# Altium schematic symbol library jlcpcb_2025_04_inductors_extended_0402.schlib: 1396 symbols (part 1 of 8) (continued)
## CLH1005T-3N9S-S
designator L?  Inductance: 3.9nH
Inductor, 3.9nH, 180mΩ, 400mA, SMD 0402; Manufacturer: Chilisin Elec; Manufacturer Part Number: CLH1005T-3N9S-S; Self-Resonant Frequency: 6.1GHz; Q Factor: 8@100MHz; Package Size: 0402; JLCPCB Basic Part: No; JLCPCB Part Number: C108257; Supplier 1: LCSC; Category: Inductors; Supplier Part Number 1: C108257; Rated Current: 400mA; DC Resistance: 180mΩ; RoHS: Yes; ComponentLink1Description: Datasheet; ComponentLink1URL: https://wmsc.lcsc.com/wmsc/upload/file/pdf/v2/lcsc/2304140030_Chilisin-Elec-CLH1005T-3N9S-S_C108257.pdf; ComponentLink2Description: JLCPCB Part URL; ComponentLink2URL: https://jlcpcb.com/partdetail/C108257; ComponentLink3Description: LCSC Part URL; ComponentLink3URL: https://lcsc.com/product-detail/Inductors-SMD_Chilisin-Elec-Chilisin-Elec-CLH1005T-3N9S-S_C108257.html
footprint IND-0402 (0402 (1005M) Inductor)
pins: 1, 2

## CLH1005T-3N9S-S-NP
designator L?  Inductance: 3.9nH
Inductor, 3.9nH, 180mΩ, 400mA, SMD 0402; Manufacturer: Chilisin Elec; Manufacturer Part Number: CLH1005T-3N9S-S-NP; Self-Resonant Frequency: 6.1GHz; Q Factor: 8@100MHz; Package Size: 0402; JLCPCB Basic Part: No; JLCPCB Part Number: C142225; Supplier 1: LCSC; Category: Inductors; Supplier Part Number 1: C142225; Rated Current: 400mA; DC Resistance: 180mΩ; RoHS: Yes; ComponentLink1Description: Datasheet; ComponentLink1URL: https://wmsc.lcsc.com/wmsc/upload/file/pdf/v2/lcsc/2304140030_Chilisin-Elec-CLH1005T-3N9S-S-NP_C142225.pdf; ComponentLink2Description: JLCPCB Part URL; ComponentLink2URL: https://jlcpcb.com/partdetail/C142225; ComponentLink3Description: LCSC Part URL; ComponentLink3URL: https://lcsc.com/product-detail/Inductors-SMD_Chilisin-Elec-Chilisin-Elec-CLH1005T-3N9S-S-NP_C142225.html
footprint IND-0402 (0402 (1005M) Inductor)
pins: 1, 2

## CLH1005T-4N3S-S
designator L?  Inductance: 4.3nH
Inductor, 4.3nH, 160mΩ, 400mA, SMD 0402; Manufacturer: Chilisin Elec; Manufacturer Part Number: CLH1005T-4N3S-S; Self-Resonant Frequency: 6GHz; Q Factor: 8@100MHz; Package Size: 0402; JLCPCB Basic Part: No; JLCPCB Part Number: C108258; Supplier 1: LCSC; Category: Inductors; Supplier Part Number 1: C108258; Rated Current: 400mA; DC Resistance: 160mΩ; RoHS: Yes; ComponentLink1Description: Datasheet; ComponentLink1URL: https://wmsc.lcsc.com/wmsc/upload/file/pdf/v2/lcsc/2304140030_Chilisin-Elec-CLH1005T-4N3S-S_C108258.pdf; ComponentLink2Description: JLCPCB Part URL; ComponentLink2URL: https://jlcpcb.com/partdetail/C108258; ComponentLink3Description: LCSC Part URL; ComponentLink3URL: https://lcsc.com/product-detail/Inductors-SMD_Chilisin-Elec-Chilisin-Elec-CLH1005T-4N3S-S_C108258.html
footprint IND-0402 (0402 (1005M) Inductor)
pins: 1, 2

## CLH1005T-4N7S-S-NP
designator L?  Inductance: 4.7nH
Inductor, 4.7nH, 180mΩ, 400mA, SMD 0402; Manufacturer: Chilisin Elec; Manufacturer Part Number: CLH1005T-4N7S-S-NP; Self-Resonant Frequency: 6GHz; Q Factor: 8@100MHz; Package Size: 0402; JLCPCB Basic Part: No; JLCPCB Part Number: C142221; Supplier 1: LCSC; Category: Inductors; Supplier Part Number 1: C142221; Rated Current: 400mA; DC Resistance: 180mΩ; RoHS: Yes; ComponentLink1Description: Datasheet; ComponentLink1URL: https://wmsc.lcsc.com/wmsc/upload/file/pdf/v2/lcsc/2304140030_Chilisin-Elec-CLH1005T-4N7S-S-NP_C142221.pdf; ComponentLink2Description: JLCPCB Part URL; ComponentLink2URL: https://jlcpcb.com/partdetail/C142221; ComponentLink3Description: LCSC Part URL; ComponentLink3URL: https://lcsc.com/product-detail/Inductors-SMD_Chilisin-Elec-Chilisin-Elec-CLH1005T-4N7S-S-NP_C142221.html
footprint IND-0402 (0402 (1005M) Inductor)
pins: 1, 2

## CLH1005T-5N1S-H
designator L?  Inductance: 5.1nH
Inductor, 5.1nH, SMD 0402; Manufacturer: Chilisin Elec; Manufacturer Part Number: CLH1005T-5N1S-H; Package Size: 0402; JLCPCB Basic Part: No; JLCPCB Part Number: C329635; Supplier 1: LCSC; Category: Inductors; Supplier Part Number 1: C329635; RoHS: Yes; ComponentLink1Description: Datasheet; ComponentLink1URL: https://wmsc.lcsc.com/wmsc/upload/file/pdf/v2/lcsc/1912111437_Chilisin-Elec-CLH1005T-5N1S-H_C329635.pdf; ComponentLink2Description: JLCPCB Part URL; ComponentLink2URL: https://jlcpcb.com/partdetail/C329635; ComponentLink3Description: LCSC Part URL; ComponentLink3URL: https://lcsc.com/product-detail/Inductors-SMD_Chilisin-Elec-Chilisin-Elec-CLH1005T-5N1S-H_C329635.html
footprint IND-0402 (0402 (1005M) Inductor)
pins: 1, 2

## CLH1005T-5N1S-S
designator L?  Inductance: 5.1nH
Inductor, 5.1nH, 200mΩ, 400mA, SMD 0402; Manufacturer: Chilisin Elec; Manufacturer Part Number: CLH1005T-5N1S-S; Self-Resonant Frequency: 5.3GHz; Q Factor: 8@100MHz; Package Size: 0402; JLCPCB Basic Part: No; JLCPCB Part Number: C142219; Supplier 1: LCSC; Category: Inductors; Supplier Part Number 1: C142219; Rated Current: 400mA; DC Resistance: 200mΩ; RoHS: Yes; ComponentLink1Description: Datasheet; ComponentLink1URL: https://wmsc.lcsc.com/wmsc/upload/file/pdf/v2/lcsc/2304140030_Chilisin-Elec-CLH1005T-5N1S-S_C142219.pdf; ComponentLink2Description: JLCPCB Part URL; ComponentLink2URL: https://jlcpcb.com/partdetail/C142219; ComponentLink3Description: LCSC Part URL; ComponentLink3URL: https://lcsc.com/product-detail/Inductors-SMD_Chilisin-Elec-Chilisin-Elec-CLH1005T-5N1S-S_C142219.html
footprint IND-0402 (0402 (1005M) Inductor)
pins: 1, 2

## CLH1005T-5N1S-S-NP
designator L?  Inductance: 5.1nH
Inductor, 5.1nH, 200mΩ, 400mA, SMD 0402; Manufacturer: Chilisin Elec; Manufacturer Part Number: CLH1005T-5N1S-S-NP; Self-Resonant Frequency: 5.3GHz; Q Factor: 8@100MHz; Package Size: 0402; JLCPCB Basic Part: No; JLCPCB Part Number: C142218; Supplier 1: LCSC; Category: Inductors; Supplier Part Number 1: C142218; Rated Current: 400mA; DC Resistance: 200mΩ; RoHS: Yes; ComponentLink1Description: Datasheet; ComponentLink1URL: https://wmsc.lcsc.com/wmsc/upload/file/pdf/v2/lcsc/2304140030_Chilisin-Elec-CLH1005T-5N1S-S-NP_C142218.pdf; ComponentLink2Description: JLCPCB Part URL; ComponentLink2URL: https://jlcpcb.com/partdetail/C142218; ComponentLink3Description: LCSC Part URL; ComponentLink3URL: https://lcsc.com/product-detail/Inductors-SMD_Chilisin-Elec-Chilisin-Elec-CLH1005T-5N1S-S-NP_C142218.html
footprint IND-0402 (0402 (1005M) Inductor)
pins: 1, 2

## CLH1005T-5N6S-S
designator L?  Inductance: 5.6nH
Inductor, 5.6nH, 200mΩ, 400mA, SMD 0402; Manufacturer: Chilisin Elec; Manufacturer Part Number: CLH1005T-5N6S-S; Self-Resonant Frequency: 5.1GHz; Q Factor: 8@100MHz; Package Size: 0402; JLCPCB Basic Part: No; JLCPCB Part Number: C108259; Supplier 1: LCSC; Category: Inductors; Supplier Part Number 1: C108259; Rated Current: 400mA; DC Resistance: 200mΩ; RoHS: Yes; ComponentLink1Description: Datasheet; ComponentLink1URL: https://wmsc.lcsc.com/wmsc/upload/file/pdf/v2/lcsc/2304140030_Chilisin-Elec-CLH1005T-5N6S-S_C108259.pdf; ComponentLink2Description: JLCPCB Part URL; ComponentLink2URL: https://jlcpcb.com/partdetail/C108259; ComponentLink3Description: LCSC Part URL; ComponentLink3URL: https://lcsc.com/product-detail/Inductors-SMD_Chilisin-Elec-Chilisin-Elec-CLH1005T-5N6S-S_C108259.html
footprint IND-0402 (0402 (1005M) Inductor)
pins: 1, 2

## CLH1005T-5N6S-S-NP
designator L?  Inductance: 5.6nH
Inductor, 5.6nH, 200mΩ, 400mA, SMD 0402; Manufacturer: Chilisin Elec; Manufacturer Part Number: CLH1005T-5N6S-S-NP; Self-Resonant Frequency: 5.1GHz; Q Factor: 8@100MHz; Package Size: 0402; JLCPCB Basic Part: No; JLCPCB Part Number: C142217; Supplier 1: LCSC; Category: Inductors; Supplier Part Number 1: C142217; Rated Current: 400mA; DC Resistance: 200mΩ; RoHS: Yes; ComponentLink1Description: Datasheet; ComponentLink1URL: https://wmsc.lcsc.com/wmsc/upload/file/pdf/v2/lcsc/2304140030_Chilisin-Elec-CLH1005T-5N6S-S-NP_C142217.pdf; ComponentLink2Description: JLCPCB Part URL; ComponentLink2URL: https://jlcpcb.com/partdetail/C142217; ComponentLink3Description: LCSC Part URL; ComponentLink3URL: https://lcsc.com/product-detail/Inductors-SMD_Chilisin-Elec-Chilisin-Elec-CLH1005T-5N6S-S-NP_C142217.html
footprint IND-0402 (0402 (1005M) Inductor)
pins: 1, 2

## CLH1005T-6N2J-S-NP
designator L?  Inductance: 6.2nH
Inductor, 6.2nH, ±5%, 220mΩ, 400mA, SMD 0402; Manufacturer: Chilisin Elec; Manufacturer Part Number: CLH1005T-6N2J-S-NP; Self-Resonant Frequency: 4.5GHz; Q Factor: 8@100MHz; Package Size: 0402; JLCPCB Basic Part: No; JLCPCB Part Number: C329636; Supplier 1: LCSC; Category: Inductors; Supplier Part Number 1: C329636; Tolerance: ±5%; Rated Current: 400mA; DC Resistance: 220mΩ; RoHS: Yes; ComponentLink1Description: Datasheet; ComponentLink1URL: https://wmsc.lcsc.com/wmsc/upload/file/pdf/v2/lcsc/1912111437_Chilisin-Elec-CLH1005T-6N2J-S-NP_C329636.pdf; ComponentLink2Description: JLCPCB Part URL; ComponentLink2URL: https://jlcpcb.com/partdetail/C329636; ComponentLink3Description: LCSC Part URL; ComponentLink3URL: https://lcsc.com/product-detail/Inductors-SMD_Chilisin-Elec-Chilisin-Elec-CLH1005T-6N2J-S-NP_C329636.html
footprint IND-0402 (0402 (1005M) Inductor)
pins: 1, 2

## CLH1005T-6N2S-S-NP
designator L?  Inductance: 6.2nH
Inductor, 6.2nH, 220mΩ, 400mA, SMD 0402; Manufacturer: Chilisin Elec; Manufacturer Part Number: CLH1005T-6N2S-S-NP; Self-Resonant Frequency: 4.5GHz; Q Factor: 8@100MHz; Package Size: 0402; JLCPCB Basic Part: No; JLCPCB Part Number: C122957; Supplier 1: LCSC; Category: Inductors; Supplier Part Number 1: C122957; Rated Current: 400mA; DC Resistance: 220mΩ; RoHS: Yes; ComponentLink1Description: Datasheet; ComponentLink1URL: https://wmsc.lcsc.com/wmsc/upload/file/pdf/v2/lcsc/2304140030_Chilisin-Elec-CLH1005T-6N2S-S-NP_C122957.pdf; ComponentLink2Description: JLCPCB Part URL; ComponentLink2URL: https://jlcpcb.com/partdetail/C122957; ComponentLink3Description: LCSC Part URL; ComponentLink3URL: https://lcsc.com/product-detail/Inductors-SMD_Chilisin-Elec-Chilisin-Elec-CLH1005T-6N2S-S-NP_C122957.html
footprint IND-0402 (0402 (1005M) Inductor)
pins: 1, 2

## CLH1005T-6N8J-S
designator L?  Inductance: 6.8nH
Inductor, 6.8nH, ±5%, 240mΩ, 400mA, SMD 0402; Manufacturer: Chilisin Elec; Manufacturer Part Number: CLH1005T-6N8J-S; Self-Resonant Frequency: 4.55GHz; Q Factor: 8@100MHz; Package Size: 0402; JLCPCB Basic Part: No; JLCPCB Part Number: C108260; Supplier 1: LCSC; Category: Inductors; Supplier Part Number 1: C108260; Tolerance: ±5%; Rated Current: 400mA; DC Resistance: 240mΩ; RoHS: Yes; ComponentLink1Description: Datasheet; ComponentLink1URL: https://wmsc.lcsc.com/wmsc/upload/file/pdf/v2/lcsc/2304140030_Chilisin-Elec-CLH1005T-6N8J-S_C108260.pdf; ComponentLink2Description: JLCPCB Part URL; ComponentLink2URL: https://jlcpcb.com/partdetail/C108260; ComponentLink3Description: LCSC Part URL; ComponentLink3URL: https://lcsc.com/product-detail/Inductors-SMD_Chilisin-Elec-Chilisin-Elec-CLH1005T-6N8J-S_C108260.html
footprint IND-0402 (0402 (1005M) Inductor)
pins: 1, 2

## CLH1005T-6N8J-S-NP
designator L?  Inductance: 6.8nH
Inductor, 6.8nH, ±5%, 240mΩ, 400mA, SMD 0402; Manufacturer: Chilisin Elec; Manufacturer Part Number: CLH1005T-6N8J-S-NP; Self-Resonant Frequency: 4.55GHz; Q Factor: 8@100MHz; Package Size: 0402; JLCPCB Basic Part: No; JLCPCB Part Number: C142216; Supplier 1: LCSC; Category: Inductors; Supplier Part Number 1: C142216; Tolerance: ±5%; Rated Current: 400mA; DC Resistance: 240mΩ; RoHS: Yes; ComponentLink1Description: Datasheet; ComponentLink1URL: https://wmsc.lcsc.com/wmsc/upload/file/pdf/v2/lcsc/2304140030_Chilisin-Elec-CLH1005T-6N8J-S-NP_C142216.pdf; ComponentLink2Description: JLCPCB Part URL; ComponentLink2URL: https://jlcpcb.com/partdetail/C142216; ComponentLink3Description: LCSC Part URL; ComponentLink3URL: https://lcsc.com/product-detail/Inductors-SMD_Chilisin-Elec-Chilisin-Elec-CLH1005T-6N8J-S-NP_C142216.html
footprint IND-0402 (0402 (1005M) Inductor)
pins: 1, 2

## CLH1005T-7N5J-S-NP
designator L?  Inductance: 7.5nH
Inductor, 7.5nH, ±5%, 250mΩ, 400mA, SMD 0402; Manufacturer: Chilisin Elec; Manufacturer Part Number: CLH1005T-7N5J-S-NP; Self-Resonant Frequency: 4.2GHz; Q Factor: 8@100MHz; Package Size: 0402; JLCPCB Basic Part: No; JLCPCB Part Number: C142215; Supplier 1: LCSC; Category: Inductors; Supplier Part Number 1: C142215; Tolerance: ±5%; Rated Current: 400mA; DC Resistance: 250mΩ; RoHS: Yes; ComponentLink1Description: Datasheet; ComponentLink1URL: https://wmsc.lcsc.com/wmsc/upload/file/pdf/v2/lcsc/2304140030_Chilisin-Elec-CLH1005T-7N5J-S-NP_C142215.pdf; ComponentLink2Description: JLCPCB Part URL; ComponentLink2URL: https://jlcpcb.com/partdetail/C142215; ComponentLink3Description: LCSC Part URL; ComponentLink3URL: https://lcsc.com/product-detail/Inductors-SMD_Chilisin-Elec-Chilisin-Elec-CLH1005T-7N5J-S-NP_C142215.html
footprint IND-0402 (0402 (1005M) Inductor)
pins: 1, 2

## CLH1005T-8N2J-S
designator L?  Inductance: 8.2nH
Inductor, 8.2nH, ±5%, 240mΩ, 300mA, SMD 0402; Manufacturer: Chilisin Elec; Manufacturer Part Number: CLH1005T-8N2J-S; Self-Resonant Frequency: 4.1GHz; Q Factor: 8@100MHz; Package Size: 0402; JLCPCB Basic Part: No; JLCPCB Part Number: C108262; Supplier 1: LCSC; Category: Inductors; Supplier Part Number 1: C108262; Tolerance: ±5%; Rated Current: 300mA; DC Resistance: 240mΩ; RoHS: Yes; ComponentLink1Description: Datasheet; ComponentLink1URL: https://wmsc.lcsc.com/wmsc/upload/file/pdf/v2/lcsc/2304140030_Chilisin-Elec-CLH1005T-8N2J-S_C108262.pdf; ComponentLink2Description: JLCPCB Part URL; ComponentLink2URL: https://jlcpcb.com/partdetail/C108262; ComponentLink3Description: LCSC Part URL; ComponentLink3URL: https://lcsc.com/product-detail/Inductors-SMD_Chilisin-Elec-Chilisin-Elec-CLH1005T-8N2J-S_C108262.html
footprint IND-0402 (0402 (1005M) Inductor)
pins: 1, 2

## CLH1005T-8N2J-S-NP
designator L?  Inductance: 8.2nH
Inductor, 8.2nH, ±5%, 240mΩ, 300mA, SMD 0402; Manufacturer: Chilisin Elec; Manufacturer Part Number: CLH1005T-8N2J-S-NP; Self-Resonant Frequency: 4.1GHz; Q Factor: 8@100MHz; Package Size: 0402; JLCPCB Basic Part: No; JLCPCB Part Number: C142213; Supplier 1: LCSC; Category: Inductors; Supplier Part Number 1: C142213; Tolerance: ±5%; Rated Current: 300mA; DC Resistance: 240mΩ; RoHS: Yes; ComponentLink1Description: Datasheet; ComponentLink1URL: https://wmsc.lcsc.com/wmsc/upload/file/pdf/v2/lcsc/2304140030_Chilisin-Elec-CLH1005T-8N2J-S-NP_C142213.pdf; ComponentLink2Description: JLCPCB Part URL; ComponentLink2URL: https://jlcpcb.com/partdetail/C142213; ComponentLink3Description: LCSC Part URL; ComponentLink3URL: https://lcsc.com/product-detail/Inductors-SMD_Chilisin-Elec-Chilisin-Elec-CLH1005T-8N2J-S-NP_C142213.html
footprint IND-0402 (0402 (1005M) Inductor)
pins: 1, 2

## CLH1005T-9N1J-H
designator L?  Inductance: 9.1nH
Inductor, 9.1nH, ±5%, SMD 0402; Manufacturer: Chilisin Elec; Manufacturer Part Number: CLH1005T-9N1J-H; Package Size: 0402; JLCPCB Basic Part: No; JLCPCB Part Number: C329639; Supplier 1: LCSC; Category: Inductors; Supplier Part Number 1: C329639; Tolerance: ±5%; RoHS: Yes; ComponentLink1Description: Datasheet; ComponentLink1URL: https://wmsc.lcsc.com/wmsc/upload/file/pdf/v2/lcsc/1912111437_Chilisin-Elec-CLH1005T-9N1J-H_C329639.pdf; ComponentLink2Description: JLCPCB Part URL; ComponentLink2URL: https://jlcpcb.com/partdetail/C329639; ComponentLink3Description: LCSC Part URL; ComponentLink3URL: https://lcsc.com/product-detail/Inductors-SMD_Chilisin-Elec-Chilisin-Elec-CLH1005T-9N1J-H_C329639.html
footprint IND-0402 (0402 (1005M) Inductor)
pins: 1, 2

## CLH1005T-9N1J-S
designator L?  Inductance: 9.1nH
Inductor, 9.1nH, ±5%, 260mΩ, 300mA, SMD 0402; Manufacturer: Chilisin Elec; Manufacturer Part Number: CLH1005T-9N1J-S; Self-Resonant Frequency: 3.9GHz; Q Factor: 8@100MHz; Package Size: 0402; JLCPCB Basic Part: No; JLCPCB Part Number: C142212; Supplier 1: LCSC; Category: Inductors; Supplier Part Number 1: C142212; Tolerance: ±5%; Rated Current: 300mA; DC Resistance: 260mΩ; RoHS: Yes; ComponentLink1Description: Datasheet; ComponentLink1URL: https://wmsc.lcsc.com/wmsc/upload/file/pdf/v2/lcsc/2304140030_Chilisin-Elec-CLH1005T-9N1J-S_C142212.pdf; ComponentLink2Description: JLCPCB Part URL; ComponentLink2URL: https://jlcpcb.com/partdetail/C142212; ComponentLink3Description: LCSC Part URL; ComponentLink3URL: https://lcsc.com/product-detail/Inductors-SMD_Chilisin-Elec-Chilisin-Elec-CLH1005T-9N1J-S_C142212.html
footprint IND-0402 (0402 (1005M) Inductor)
pins: 1, 2

## CLH1005T-9N1J-S-NP
designator L?  Inductance: 9.1nH
Inductor, 9.1nH, ±5%, 260mΩ, 300mA, SMD 0402; Manufacturer: Chilisin Elec; Manufacturer Part Number: CLH1005T-9N1J-S-NP; Self-Resonant Frequency: 3.9GHz; Q Factor: 8@100MHz; Package Size: 0402; JLCPCB Basic Part: No; JLCPCB Part Number: C142211; Supplier 1: LCSC; Category: Inductors; Supplier Part Number 1: C142211; Tolerance: ±5%; Rated Current: 300mA; DC Resistance: 260mΩ; RoHS: Yes; ComponentLink1Description: Datasheet; ComponentLink1URL: https://wmsc.lcsc.com/wmsc/upload/file/pdf/v2/lcsc/2304140030_Chilisin-Elec-CLH1005T-9N1J-S-NP_C142211.pdf; ComponentLink2Description: JLCPCB Part URL; ComponentLink2URL: https://jlcpcb.com/partdetail/C142211; ComponentLink3Description: LCSC Part URL; ComponentLink3URL: https://lcsc.com/product-detail/Inductors-SMD_Chilisin-Elec-Chilisin-Elec-CLH1005T-9N1J-S-NP_C142211.html
footprint IND-0402 (0402 (1005M) Inductor)
pins: 1, 2

## CLH1005T-10NJ-S
designator L?  Inductance: 10nH
Inductor, 10nH, ±5%, 260mΩ, 300mA, SMD 0402; Manufacturer: Chilisin Elec; Manufacturer Part Number: CLH1005T-10NJ-S; Self-Resonant Frequency: 3.9GHz; Q Factor: 8@100MHz; Package Size: 0402; JLCPCB Basic Part: No; JLCPCB Part Number: C108247; Supplier 1: LCSC; Category: Inductors; Supplier Part Number 1: C108247; Tolerance: ±5%; Rated Current: 300mA; DC Resistance: 260mΩ; RoHS: Yes; ComponentLink1Description: Datasheet; ComponentLink1URL: https://wmsc.lcsc.com/wmsc/upload/file/pdf/v2/lcsc/2304140030_Chilisin-Elec-CLH1005T-10NJ-S_C108247.pdf; ComponentLink2Description: JLCPCB Part URL; ComponentLink2URL: https://jlcpcb.com/partdetail/C108247; ComponentLink3Description: LCSC Part URL; ComponentLink3URL: https://lcsc.com/product-detail/Inductors-SMD_Chilisin-Elec-Chilisin-Elec-CLH1005T-10NJ-S_C108247.html
footprint IND-0402 (0402 (1005M) Inductor)
pins: 1, 2

## CLH1005T-10NJ-S-NP
designator L?  Inductance: 10nH
Inductor, 10nH, ±5%, 260mΩ, 300mA, SMD 0402; Manufacturer: Chilisin Elec; Manufacturer Part Number: CLH1005T-10NJ-S-NP; Self-Resonant Frequency: 3.9GHz; Q Factor: 8@100MHz; Package Size: 0402; JLCPCB Basic Part: No; JLCPCB Part Number: C108248; Supplier 1: LCSC; Category: Inductors; Supplier Part Number 1: C108248; Tolerance: ±5%; Rated Current: 300mA; DC Resistance: 260mΩ; RoHS: Yes; ComponentLink1Description: Datasheet; ComponentLink1URL: https://wmsc.lcsc.com/wmsc/upload/file/pdf/v2/lcsc/2304140030_Chilisin-Elec-CLH1005T-10NJ-S-NP_C108248.pdf; ComponentLink2Description: JLCPCB Part URL; ComponentLink2URL: https://jlcpcb.com/partdetail/C108248; ComponentLink3Description: LCSC Part URL; ComponentLink3URL: https://lcsc.com/product-detail/Inductors-SMD_Chilisin-Elec-Chilisin-Elec-CLH1005T-10NJ-S-NP_C108248.html
footprint IND-0402 (0402 (1005M) Inductor)
pins: 1, 2

## CLH1005T-12NJ-S
designator L?  Inductance: 12nH
Inductor, 12nH, ±5%, 400mΩ, 300mA, SMD 0402; Manufacturer: Chilisin Elec; Manufacturer Part Number: CLH1005T-12NJ-S; Self-Resonant Frequency: 3GHz; Q Factor: 8@100MHz; Package Size: 0402; JLCPCB Basic Part: No; JLCPCB Part Number: C142253; Supplier 1: LCSC; Category: Inductors; Supplier Part Number 1: C142253; Tolerance: ±5%; Rated Current: 300mA; DC Resistance: 400mΩ; RoHS: Yes; ComponentLink1Description: Datasheet; ComponentLink1URL: https://wmsc.lcsc.com/wmsc/upload/file/pdf/v2/lcsc/2304140030_Chilisin-Elec-CLH1005T-12NJ-S_C142253.pdf; ComponentLink2Description: JLCPCB Part URL; ComponentLink2URL: https://jlcpcb.com/partdetail/C142253; ComponentLink3Description: LCSC Part URL; ComponentLink3URL: https://lcsc.com/product-detail/Inductors-SMD_Chilisin-Elec-Chilisin-Elec-CLH1005T-12NJ-S_C142253.html
footprint IND-0402 (0402 (1005M) Inductor)
pins: 1, 2

## CLH1005T-12NJ-S-NP
designator L?  Inductance: 12nH
Inductor, 12nH, ±5%, 280mΩ, 300mA, SMD 0402; Manufacturer: Chilisin Elec; Manufacturer Part Number: CLH1005T-12NJ-S-NP; Self-Resonant Frequency: 3GHz; Q Factor: 8@100MHz; Package Size: 0402; JLCPCB Basic Part: No; JLCPCB Part Number: C108249; Supplier 1: LCSC; Category: Inductors; Supplier Part Number 1: C108249; Tolerance: ±5%; Rated Current: 300mA; DC Resistance: 280mΩ; RoHS: Yes; ComponentLink1Description: Datasheet; ComponentLink1URL: https://wmsc.lcsc.com/wmsc/upload/file/pdf/v2/lcsc/2304140030_Chilisin-Elec-CLH1005T-12NJ-S-NP_C108249.pdf; ComponentLink2Description: JLCPCB Part URL; ComponentLink2URL: https://jlcpcb.com/partdetail/C108249; ComponentLink3Description: LCSC Part URL; ComponentLink3URL: https://lcsc.com/product-detail/Inductors-SMD_Chilisin-Elec-Chilisin-Elec-CLH1005T-12NJ-S-NP_C108249.html
footprint IND-0402 (0402 (1005M) Inductor)
pins: 1, 2

## CLH1005T-15NJ-S
designator L?  Inductance: 15nH
Inductor, 15nH, ±5%, 500mΩ, 300mA, SMD 0402; Manufacturer: Chilisin Elec; Manufacturer Part Number: CLH1005T-15NJ-S; Self-Resonant Frequency: 2.8GHz; Q Factor: 8@100MHz; Package Size: 0402; JLCPCB Basic Part: No; JLCPCB Part Number: C142252; Supplier 1: LCSC; Category: Inductors; Supplier Part Number 1: C142252; Tolerance: ±5%; Rated Current: 300mA; DC Resistance: 500mΩ; RoHS: Yes; ComponentLink1Description: Datasheet; ComponentLink1URL: https://wmsc.lcsc.com/wmsc/upload/file/pdf/v2/lcsc/2304140030_Chilisin-Elec-CLH1005T-15NJ-S_C142252.pdf; ComponentLink2Description: JLCPCB Part URL; ComponentLink2URL: https://jlcpcb.com/partdetail/C142252; ComponentLink3Description: LCSC Part URL; ComponentLink3URL: https://lcsc.com/product-detail/Inductors-SMD_Chilisin-Elec-Chilisin-Elec-CLH1005T-15NJ-S_C142252.html
footprint IND-0402 (0402 (1005M) Inductor)
pins: 1, 2

## CLH1005T-15NJ-S-NP
designator L?  Inductance: 15nH
Inductor, 15nH, ±5%, 320mΩ, 300mA, SMD 0402; Manufacturer: Chilisin Elec; Manufacturer Part Number: CLH1005T-15NJ-S-NP; Self-Resonant Frequency: 2.5GHz; Q Factor: 8@100MHz; Package Size: 0402; JLCPCB Basic Part: No; JLCPCB Part Number: C108250; Supplier 1: LCSC; Category: Inductors; Supplier Part Number 1: C108250; Tolerance: ±5%; Rated Current: 300mA; DC Resistance: 320mΩ; RoHS: Yes; ComponentLink1Description: Datasheet; ComponentLink1URL: https://wmsc.lcsc.com/wmsc/upload/file/pdf/v2/lcsc/2304140030_Chilisin-Elec-CLH1005T-15NJ-S-NP_C108250.pdf; ComponentLink2Description: JLCPCB Part URL; ComponentLink2URL: https://jlcpcb.com/partdetail/C108250; ComponentLink3Description: LCSC Part URL; ComponentLink3URL: https://lcsc.com/product-detail/Inductors-SMD_Chilisin-Elec-Chilisin-Elec-CLH1005T-15NJ-S-NP_C108250.html
footprint IND-0402 (0402 (1005M) Inductor)
pins: 1, 2

## CLH1005T-18NJ-H
designator L?  Inductance: 18nH
Inductor, 18nH, ±5%, 550mΩ, 300mA, SMD 0402; Manufacturer: Chilisin Elec; Manufacturer Part Number: CLH1005T-18NJ-H; Package Size: 0402; JLCPCB Basic Part: No; JLCPCB Part Number: C329628; Supplier 1: LCSC; Category: Inductors; Supplier Part Number 1: C329628; Tolerance: ±5%; Rated Current: 300mA; DC Resistance: 550mΩ; RoHS: Yes; ComponentLink1Description: Datasheet; ComponentLink1URL: https://wmsc.lcsc.com/wmsc/upload/file/pdf/v2/lcsc/1912111437_Chilisin-Elec-CLH1005T-18NJ-H_C329628.pdf; ComponentLink2Description: JLCPCB Part URL; ComponentLink2URL: https://jlcpcb.com/partdetail/C329628; ComponentLink3Description: LCSC Part URL; ComponentLink3URL: https://lcsc.com/product-detail/Inductors-SMD_Chilisin-Elec-Chilisin-Elec-CLH1005T-18NJ-H_C329628.html
footprint IND-0402 (0402 (1005M) Inductor)
pins: 1, 2

## CLH1005T-18NJ-S-NP
designator L?  Inductance: 18nH
Inductor, 18nH, ±5%, 360mΩ, 300mA, SMD 0402; Manufacturer: Chilisin Elec; Manufacturer Part Number: CLH1005T-18NJ-S-NP; Self-Resonant Frequency: 2.2GHz; Q Factor: 8@100MHz; Package Size: 0402; JLCPCB Basic Part: No; JLCPCB Part Number: C142250; Supplier 1: LCSC; Category: Inductors; Supplier Part Number 1: C142250; Tolerance: ±5%; Rated Current: 300mA; DC Resistance: 360mΩ; RoHS: Yes; ComponentLink1Description: Datasheet; ComponentLink1URL: https://wmsc.lcsc.com/wmsc/upload/file/pdf/v2/lcsc/2304140030_Chilisin-Elec-CLH1005T-18NJ-S-NP_C142250.pdf; ComponentLink2Description: JLCPCB Part URL; ComponentLink2URL: https://jlcpcb.com/partdetail/C142250; ComponentLink3Description: LCSC Part URL; ComponentLink3URL: https://lcsc.com/product-detail/Inductors-SMD_Chilisin-Elec-Chilisin-Elec-CLH1005T-18NJ-S-NP_C142250.html
footprint IND-0402 (0402 (1005M) Inductor)
pins: 1, 2

## CLH1005T-22NJ-S
designator L?  Inductance: 22nH
Inductor, 22nH, ±5%, 700mΩ, 300mA, SMD 0402; Manufacturer: Chilisin Elec; Manufacturer Part Number: CLH1005T-22NJ-S; Self-Resonant Frequency: 2.2GHz; Q Factor: 8@100MHz; Package Size: 0402; JLCPCB Basic Part: No; JLCPCB Part Number: C142243; Supplier 1: LCSC; Category: Inductors; Supplier Part Number 1: C142243; Tolerance: ±5%; Rated Current: 300mA; DC Resistance: 700mΩ; RoHS: Yes; ComponentLink1Description: Datasheet; ComponentLink1URL: https://wmsc.lcsc.com/wmsc/upload/file/pdf/v2/lcsc/2304140030_Chilisin-Elec-CLH1005T-22NJ-S_C142243.pdf; ComponentLink2Description: JLCPCB Part URL; ComponentLink2URL: https://jlcpcb.com/partdetail/C142243; ComponentLink3Description: LCSC Part URL; ComponentLink3URL: https://lcsc.com/product-detail/Inductors-SMD_Chilisin-Elec-Chilisin-Elec-CLH1005T-22NJ-S_C142243.html
footprint IND-0402 (0402 (1005M) Inductor)
pins: 1, 2

## CLH1005T-22NJ-S-NP
designator L?  Inductance: 22nH
Inductor, 22nH, ±5%, 420mΩ, 300mA, SMD 0402; Manufacturer: Chilisin Elec; Manufacturer Part Number: CLH1005T-22NJ-S-NP; Self-Resonant Frequency: 1.9GHz; Q Factor: 8@100MHz; Package Size: 0402; JLCPCB Basic Part: No; JLCPCB Part Number: C142242; Supplier 1: LCSC; Category: Inductors; Supplier Part Number 1: C142242; Tolerance: ±5%; Rated Current: 300mA; DC Resistance: 420mΩ; RoHS: Yes; ComponentLink1Description: Datasheet; ComponentLink1URL: https://wmsc.lcsc.com/wmsc/upload/file/pdf/v2/lcsc/2304140030_Chilisin-Elec-CLH1005T-22NJ-S-NP_C142242.pdf; ComponentLink2Description: JLCPCB Part URL; ComponentLink2URL: https://jlcpcb.com/partdetail/C142242; ComponentLink3Description: LCSC Part URL; ComponentLink3URL: https://lcsc.com/product-detail/Inductors-SMD_Chilisin-Elec-Chilisin-Elec-CLH1005T-22NJ-S-NP_C142242.html
footprint IND-0402 (0402 (1005M) Inductor)
pins: 1, 2

## CLH1005T-27NJ-S
designator L?  Inductance: 27nH
Inductor, 27nH, ±5%, 460mΩ, 300mA, SMD 0402; Manufacturer: Chilisin Elec; Manufacturer Part Number: CLH1005T-27NJ-S; Self-Resonant Frequency: 2GHz; Q Factor: 8@100MHz; Package Size: 0402; JLCPCB Basic Part: No; JLCPCB Part Number: C108253; Supplier 1: LCSC; Category: Inductors; Supplier Part Number 1: C108253; Tolerance: ±5%; Rated Current: 300mA; DC Resistance: 460mΩ; RoHS: Yes; ComponentLink1Description: Datasheet; ComponentLink1URL: https://wmsc.lcsc.com/wmsc/upload/file/pdf/v2/lcsc/2304140030_Chilisin-Elec-CLH1005T-27NJ-S_C108253.pdf; ComponentLink2Description: JLCPCB Part URL; ComponentLink2URL: https://jlcpcb.com/partdetail/C108253; ComponentLink3Description: LCSC Part URL; ComponentLink3URL: https://lcsc.com/product-detail/Inductors-SMD_Chilisin-Elec-Chilisin-Elec-CLH1005T-27NJ-S_C108253.html
footprint IND-0402 (0402 (1005M) Inductor)
pins: 1, 2

## CLH1005T-27NJ-S-NP
designator L?  Inductance: 27nH
Inductor, 27nH, ±5%, 460mΩ, 300mA, SMD 0402; Manufacturer: Chilisin Elec; Manufacturer Part Number: CLH1005T-27NJ-S-NP; Self-Resonant Frequency: 1.7GHz; Q Factor: 8@100MHz; Package Size: 0402; JLCPCB Basic Part: No; JLCPCB Part Number: C142241; Supplier 1: LCSC; Category: Inductors; Supplier Part Number 1: C142241; Tolerance: ±5%; Rated Current: 300mA; DC Resistance: 460mΩ; RoHS: Yes; ComponentLink1Description: Datasheet; ComponentLink1URL: https://wmsc.lcsc.com/wmsc/upload/file/pdf/v2/lcsc/2304140030_Chilisin-Elec-CLH1005T-27NJ-S-NP_C142241.pdf; ComponentLink2Description: JLCPCB Part URL; ComponentLink2URL: https://jlcpcb.com/partdetail/C142241; ComponentLink3Description: LCSC Part URL; ComponentLink3URL: https://lcsc.com/product-detail/Inductors-SMD_Chilisin-Elec-Chilisin-Elec-CLH1005T-27NJ-S-NP_C142241.html
footprint IND-0402 (0402 (1005M) Inductor)
pins: 1, 2

## CLH1005T-33NJ-S
designator L?  Inductance: 33nH
Inductor, 33nH, ±5%, 900mΩ, 200mA, SMD 0402; Manufacturer: Chilisin Elec; Manufacturer Part Number: CLH1005T-33NJ-S; Self-Resonant Frequency: 1.8GHz; Q Factor: 8@100MHz; Package Size: 0402; JLCPCB Basic Part: No; JLCPCB Part Number: C142234; Supplier 1: LCSC; Category: Inductors; Supplier Part Number 1: C142234; Tolerance: ±5%; Rated Current: 200mA; DC Resistance: 900mΩ; RoHS: Yes; ComponentLink1Description: Datasheet; ComponentLink1URL: https://wmsc.lcsc.com/wmsc/upload/file/pdf/v2/lcsc/2304140030_Chilisin-Elec-CLH1005T-33NJ-S_C142234.pdf; ComponentLink2Description: JLCPCB Part URL; ComponentLink2URL: https://jlcpcb.com/partdetail/C142234; ComponentLink3Description: LCSC Part URL; ComponentLink3URL: https://lcsc.com/product-detail/Inductors-SMD_Chilisin-Elec-Chilisin-Elec-CLH1005T-33NJ-S_C142234.html
footprint IND-0402 (0402 (1005M) Inductor)
pins: 1, 2

## CLH1005T-33NJ-S-NP
designator L?  Inductance: 33nH
Inductor, 33nH, ±5%, 580mΩ, 200mA, SMD 0402; Manufacturer: Chilisin Elec; Manufacturer Part Number: CLH1005T-33NJ-S-NP; Self-Resonant Frequency: 1.6GHz; Q Factor: 8@100MHz; Package Size: 0402; JLCPCB Basic Part: No; JLCPCB Part Number: C142233; Supplier 1: LCSC; Category: Inductors; Supplier Part Number 1: C142233; Tolerance: ±5%; Rated Current: 200mA; DC Resistance: 580mΩ; RoHS: Yes; ComponentLink1Description: Datasheet; ComponentLink1URL: https://wmsc.lcsc.com/wmsc/upload/file/pdf/v2/lcsc/2304140030_Chilisin-Elec-CLH1005T-33NJ-S-NP_C142233.pdf; ComponentLink2Description: JLCPCB Part URL; ComponentLink2URL: https://jlcpcb.com/partdetail/C142233; ComponentLink3Description: LCSC Part URL; ComponentLink3URL: https://lcsc.com/product-detail/Inductors-SMD_Chilisin-Elec-Chilisin-Elec-CLH1005T-33NJ-S-NP_C142233.html
footprint IND-0402 (0402 (1005M) Inductor)
pins: 1, 2

## CLH1005T-39NJ-S-NP
designator L?  Inductance: 39nH
Inductor, 39nH, ±5%, 650mΩ, 200mA, SMD 0402; Manufacturer: Chilisin Elec; Manufacturer Part Number: CLH1005T-39NJ-S-NP; Self-Resonant Frequency: 1.2GHz; Q Factor: 8@100MHz; Package Size: 0402; JLCPCB Basic Part: No; JLCPCB Part Number: C142231; Supplier 1: LCSC; Category: Inductors; Supplier Part Number 1: C142231; Tolerance: ±5%; Rated Current: 200mA; DC Resistance: 650mΩ; RoHS: Yes; ComponentLink1Description: Datasheet; ComponentLink1URL: https://wmsc.lcsc.com/wmsc/upload/file/pdf/v2/lcsc/2304140030_Chilisin-Elec-CLH1005T-39NJ-S-NP_C142231.pdf; ComponentLink2Description: JLCPCB Part URL; ComponentLink2URL: https://jlcpcb.com/partdetail/C142231; ComponentLink3Description: LCSC Part URL; ComponentLink3URL: https://lcsc.com/product-detail/Inductors-SMD_Chilisin-Elec-Chilisin-Elec-CLH1005T-39NJ-S-NP_C142231.html
footprint IND-0402 (0402 (1005M) Inductor)
pins: 1, 2

## CLH1005T-47NJ-S
designator L?  Inductance: 47nH
Inductor, 47nH, ±5%, 1.2Ω, 150mA, SMD 0402; Manufacturer: Chilisin Elec; Manufacturer Part Number: CLH1005T-47NJ-S; Self-Resonant Frequency: 1.4GHz; Q Factor: 8@100MHz; Package Size: 0402; JLCPCB Basic Part: No; JLCPCB Part Number: C142224; Supplier 1: LCSC; Category: Inductors; Supplier Part Number 1: C142224; Tolerance: ±5%; Rated Current: 150mA; DC Resistance: 1.2Ω; RoHS: Yes; ComponentLink1Description: Datasheet; ComponentLink1URL: https://wmsc.lcsc.com/wmsc/upload/file/pdf/v2/lcsc/2304140030_Chilisin-Elec-CLH1005T-47NJ-S_C142224.pdf; ComponentLink2Description: JLCPCB Part URL; ComponentLink2URL: https://jlcpcb.com/partdetail/C142224; ComponentLink3Description: LCSC Part URL; ComponentLink3URL: https://lcsc.com/product-detail/Inductors-SMD_Chilisin-Elec-Chilisin-Elec-CLH1005T-47NJ-S_C142224.html
footprint IND-0402 (0402 (1005M) Inductor)
pins: 1, 2

## CLH1005T-47NJ-S-NP
designator L?  Inductance: 47nH
Inductor, 47nH, ±5%, 720mΩ, 200mA, SMD 0402; Manufacturer: Chilisin Elec; Manufacturer Part Number: CLH1005T-47NJ-S-NP; Self-Resonant Frequency: 1GHz; Q Factor: 8@100MHz; Package Size: 0402; JLCPCB Basic Part: No; JLCPCB Part Number: C285978; Supplier 1: LCSC; Category: Inductors; Supplier Part Number 1: C285978; Tolerance: ±5%; Rated Current: 200mA; DC Resistance: 720mΩ; RoHS: Yes; ComponentLink1Description: Datasheet; ComponentLink1URL: https://wmsc.lcsc.com/wmsc/upload/file/pdf/v2/lcsc/2304140030_Chilisin-Elec-CLH1005T-47NJ-S-NP_C285978.pdf; ComponentLink2Description: JLCPCB Part URL; ComponentLink2URL: https://jlcpcb.com/partdetail/C285978; ComponentLink3Description: LCSC Part URL; ComponentLink3URL: https://lcsc.com/product-detail/Inductors-SMD_Chilisin-Elec-Chilisin-Elec-CLH1005T-47NJ-S-NP_C285978.html
footprint IND-0402 (0402 (1005M) Inductor)
pins: 1, 2

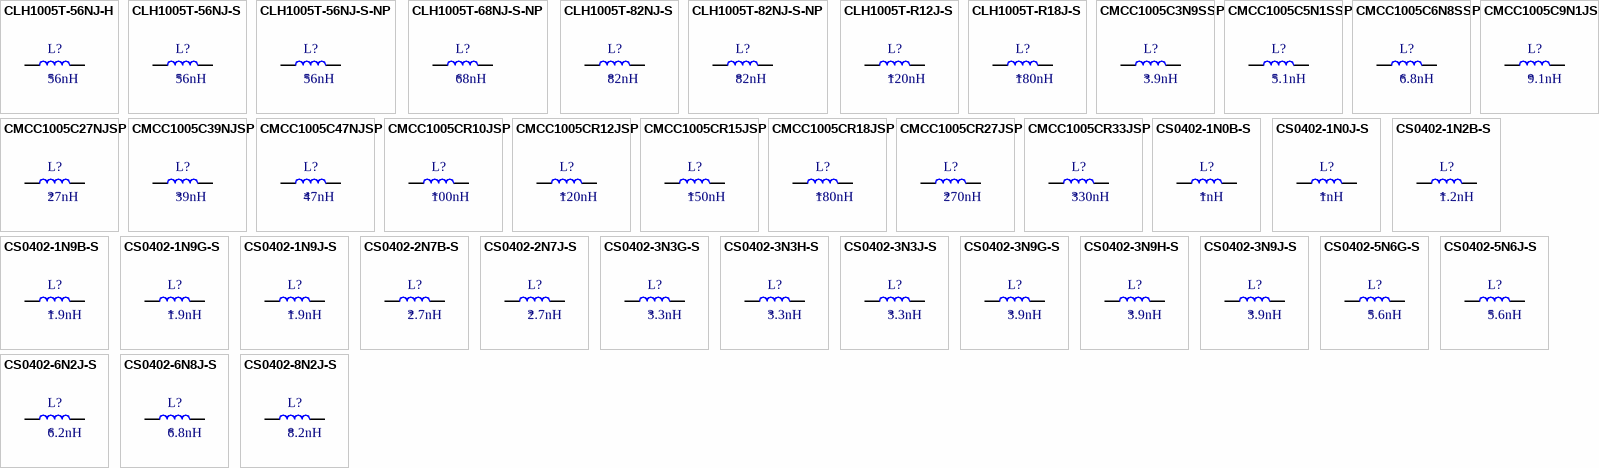
[diagram p2: symbols CLH1005T-56NJ-H to CS0402-8N2J-S]

## CLH1005T-56NJ-H
designator L?  Inductance: 56nH
Inductor, 56nH, ±5%, 1.3Ω, 150mA, SMD 0402; Manufacturer: Chilisin Elec; Manufacturer Part Number: CLH1005T-56NJ-H; Package Size: 0402; JLCPCB Basic Part: No; JLCPCB Part Number: C329634; Supplier 1: LCSC; Category: Inductors; Supplier Part Number 1: C329634; Tolerance: ±5%; Rated Current: 150mA; DC Resistance: 1.3Ω; RoHS: Yes; ComponentLink1Description: Datasheet; ComponentLink1URL: https://wmsc.lcsc.com/wmsc/upload/file/pdf/v2/lcsc/1912111437_Chilisin-Elec-CLH1005T-56NJ-H_C329634.pdf; ComponentLink2Description: JLCPCB Part URL; ComponentLink2URL: https://jlcpcb.com/partdetail/C329634; ComponentLink3Description: LCSC Part URL; ComponentLink3URL: https://lcsc.com/product-detail/Inductors-SMD_Chilisin-Elec-Chilisin-Elec-CLH1005T-56NJ-H_C329634.html
footprint IND-0402 (0402 (1005M) Inductor)
pins: 1, 2

## CLH1005T-56NJ-S
designator L?  Inductance: 56nH
Inductor, 56nH, ±5%, 1.3Ω, 150mA, SMD 0402; Manufacturer: Chilisin Elec; Manufacturer Part Number: CLH1005T-56NJ-S; Self-Resonant Frequency: 1.3GHz; Q Factor: 8@100MHz; Package Size: 0402; JLCPCB Basic Part: No; JLCPCB Part Number: C142220; Supplier 1: LCSC; Category: Inductors; Supplier Part Number 1: C142220; Tolerance: ±5%; Rated Current: 150mA; DC Resistance: 1.3Ω; RoHS: Yes; ComponentLink1Description: Datasheet; ComponentLink1URL: https://wmsc.lcsc.com/wmsc/upload/file/pdf/v2/lcsc/2304140030_Chilisin-Elec-CLH1005T-56NJ-S_C142220.pdf; ComponentLink2Description: JLCPCB Part URL; ComponentLink2URL: https://jlcpcb.com/partdetail/C142220; ComponentLink3Description: LCSC Part URL; ComponentLink3URL: https://lcsc.com/product-detail/Inductors-SMD_Chilisin-Elec-Chilisin-Elec-CLH1005T-56NJ-S_C142220.html
footprint IND-0402 (0402 (1005M) Inductor)
pins: 1, 2

## CLH1005T-56NJ-S-NP
designator L?  Inductance: 56nH
Inductor, 56nH, ±5%, 820mΩ, 200mA, SMD 0402; Manufacturer: Chilisin Elec; Manufacturer Part Number: CLH1005T-56NJ-S-NP; Self-Resonant Frequency: 800MHz; Q Factor: 8@100MHz; Package Size: 0402; JLCPCB Basic Part: No; JLCPCB Part Number: C280671; Supplier 1: LCSC; Category: Inductors; Supplier Part Number 1: C280671; Tolerance: ±5%; Rated Current: 200mA; DC Resistance: 820mΩ; RoHS: Yes; ComponentLink1Description: Datasheet; ComponentLink1URL: https://wmsc.lcsc.com/wmsc/upload/file/pdf/v2/lcsc/2304140030_Chilisin-Elec-CLH1005T-56NJ-S-NP_C280671.pdf; ComponentLink2Description: JLCPCB Part URL; ComponentLink2URL: https://jlcpcb.com/partdetail/C280671; ComponentLink3Description: LCSC Part URL; ComponentLink3URL: https://lcsc.com/product-detail/Inductors-SMD_Chilisin-Elec-Chilisin-Elec-CLH1005T-56NJ-S-NP_C280671.html
footprint IND-0402 (0402 (1005M) Inductor)
pins: 1, 2

## CLH1005T-68NJ-S-NP
designator L?  Inductance: 68nH
Inductor, 68nH, ±5%, 920mΩ, 180mA, SMD 0402; Manufacturer: Chilisin Elec; Manufacturer Part Number: CLH1005T-68NJ-S-NP; Self-Resonant Frequency: 800MHz; Q Factor: 8@100MHz; Package Size: 0402; JLCPCB Basic Part: No; JLCPCB Part Number: C122958; Supplier 1: LCSC; Category: Inductors; Supplier Part Number 1: C122958; Tolerance: ±5%; Rated Current: 180mA; DC Resistance: 920mΩ; RoHS: Yes; ComponentLink1Description: Datasheet; ComponentLink1URL: https://wmsc.lcsc.com/wmsc/upload/file/pdf/v2/lcsc/2304140030_Chilisin-Elec-CLH1005T-68NJ-S-NP_C122958.pdf; ComponentLink2Description: JLCPCB Part URL; ComponentLink2URL: https://jlcpcb.com/partdetail/C122958; ComponentLink3Description: LCSC Part URL; ComponentLink3URL: https://lcsc.com/product-detail/Inductors-SMD_Chilisin-Elec-Chilisin-Elec-CLH1005T-68NJ-S-NP_C122958.html
footprint IND-0402 (0402 (1005M) Inductor)
pins: 1, 2

## CLH1005T-82NJ-S
designator L?  Inductance: 82nH
Inductor, 82nH, ±5%, 1.6Ω, 150mA, SMD 0402; Manufacturer: Chilisin Elec; Manufacturer Part Number: CLH1005T-82NJ-S; Self-Resonant Frequency: 1GHz; Q Factor: 8@100MHz; Package Size: 0402; JLCPCB Basic Part: No; JLCPCB Part Number: C142214; Supplier 1: LCSC; Category: Inductors; Supplier Part Number 1: C142214; Tolerance: ±5%; Rated Current: 150mA; DC Resistance: 1.6Ω; RoHS: Yes; ComponentLink1Description: Datasheet; ComponentLink1URL: https://wmsc.lcsc.com/wmsc/upload/file/pdf/v2/lcsc/2304140030_Chilisin-Elec-CLH1005T-82NJ-S_C142214.pdf; ComponentLink2Description: JLCPCB Part URL; ComponentLink2URL: https://jlcpcb.com/partdetail/C142214; ComponentLink3Description: LCSC Part URL; ComponentLink3URL: https://lcsc.com/product-detail/Inductors-SMD_Chilisin-Elec-Chilisin-Elec-CLH1005T-82NJ-S_C142214.html
footprint IND-0402 (0402 (1005M) Inductor)
pins: 1, 2

## CLH1005T-82NJ-S-NP
designator L?  Inductance: 82nH
Inductor, 82nH, ±5%, 1.2Ω, 150mA, SMD 0402; Manufacturer: Chilisin Elec; Manufacturer Part Number: CLH1005T-82NJ-S-NP; Self-Resonant Frequency: 700MHz; Q Factor: 8@100MHz; Package Size: 0402; JLCPCB Basic Part: No; JLCPCB Part Number: C180939; Supplier 1: LCSC; Category: Inductors; Supplier Part Number 1: C180939; Tolerance: ±5%; Rated Current: 150mA; DC Resistance: 1.2Ω; RoHS: Yes; ComponentLink1Description: Datasheet; ComponentLink1URL: https://wmsc.lcsc.com/wmsc/upload/file/pdf/v2/lcsc/2304140030_Chilisin-Elec-CLH1005T-82NJ-S-NP_C180939.pdf; ComponentLink2Description: JLCPCB Part URL; ComponentLink2URL: https://jlcpcb.com/partdetail/C180939; ComponentLink3Description: LCSC Part URL; ComponentLink3URL: https://lcsc.com/product-detail/Inductors-SMD_Chilisin-Elec-Chilisin-Elec-CLH1005T-82NJ-S-NP_C180939.html
footprint IND-0402 (0402 (1005M) Inductor)
pins: 1, 2

## CLH1005T-R12J-S
designator L?  Inductance: 120nH
Inductor, 120nH, ±5%, 2.2Ω, 100mA, SMD 0402; Manufacturer: Chilisin Elec; Manufacturer Part Number: CLH1005T-R12J-S; Self-Resonant Frequency: 800MHz; Q Factor: 8@100MHz; Package Size: 0402; JLCPCB Basic Part: No; JLCPCB Part Number: C304176; Supplier 1: LCSC; Category: Inductors; Supplier Part Number 1: C304176; Tolerance: ±5%; Rated Current: 100mA; DC Resistance: 2.2Ω; RoHS: Yes; ComponentLink1Description: Datasheet; ComponentLink1URL: https://wmsc.lcsc.com/wmsc/upload/file/pdf/v2/lcsc/1811121632_Chilisin-Elec-CLH1005T-R12J-S_C304176.pdf; ComponentLink2Description: JLCPCB Part URL; ComponentLink2URL: https://jlcpcb.com/partdetail/C304176; ComponentLink3Description: LCSC Part URL; ComponentLink3URL: https://lcsc.com/product-detail/Inductors-SMD_Chilisin-Elec-Chilisin-Elec-CLH1005T-R12J-S_C304176.html
footprint IND-0402 (0402 (1005M) Inductor)
pins: 1, 2

## CLH1005T-R18J-S
designator L?  Inductance: 180nH
Inductor, 180nH, ±5%, 3.8Ω, 100mA, SMD 0402; Manufacturer: Chilisin Elec; Manufacturer Part Number: CLH1005T-R18J-S; Self-Resonant Frequency: 600MHz; Q Factor: 8@100MHz; Package Size: 0402; JLCPCB Basic Part: No; JLCPCB Part Number: C142209; Supplier 1: LCSC; Category: Inductors; Supplier Part Number 1: C142209; Tolerance: ±5%; Rated Current: 100mA; DC Resistance: 3.8Ω; RoHS: Yes; ComponentLink1Description: Datasheet; ComponentLink1URL: https://wmsc.lcsc.com/wmsc/upload/file/pdf/v2/lcsc/2304140030_Chilisin-Elec-CLH1005T-R18J-S_C142209.pdf; ComponentLink2Description: JLCPCB Part URL; ComponentLink2URL: https://jlcpcb.com/partdetail/C142209; ComponentLink3Description: LCSC Part URL; ComponentLink3URL: https://lcsc.com/product-detail/Inductors-SMD_Chilisin-Elec-Chilisin-Elec-CLH1005T-R18J-S_C142209.html
footprint IND-0402 (0402 (1005M) Inductor)
pins: 1, 2

## CMCC1005C3N9SSP
designator L?  Inductance: 3.9nH
Inductor, 3.9nH, 0.22Ω, 400mA, SMD 0402; Manufacturer: Cybermax; Manufacturer Part Number: CMCC1005C3N9SSP; Self-Resonant Frequency: 5200MHz; Q Factor: 8@100MHz; Package Size: 0402; JLCPCB Basic Part: No; JLCPCB Part Number: C405019; Supplier 1: LCSC; Category: Inductors; Supplier Part Number 1: C405019; Rated Current: 400mA; DC Resistance: 0.22Ω; RoHS: Yes; ComponentLink1Description: Datasheet; ComponentLink1URL: https://wmsc.lcsc.com/wmsc/upload/file/pdf/v2/lcsc/2304140030_Cybermax-CMCC1005C3N9SSP_C405019.pdf; ComponentLink2Description: JLCPCB Part URL; ComponentLink2URL: https://jlcpcb.com/partdetail/C405019; ComponentLink3Description: LCSC Part URL; ComponentLink3URL: https://lcsc.com/product-detail/Inductors-SMD_Cybermax-Cybermax-CMCC1005C3N9SSP_C405019.html
footprint IND-0402 (0402 (1005M) Inductor)
pins: 1, 2
